# Altium footprint library PCB_ConnectorHDR.PcbLib: 221 footprints (part 7 of 14)
Each footprint in its own frame and in the unit in brackets; x right, y up, seen from the top. Pads: shape width x height; smd on the part's side, far side on the other; paste and mask are expansions set on the pad; w line width, h text height; cw(c..) or ccw(c..) is an arc to the next point about the centre after c.
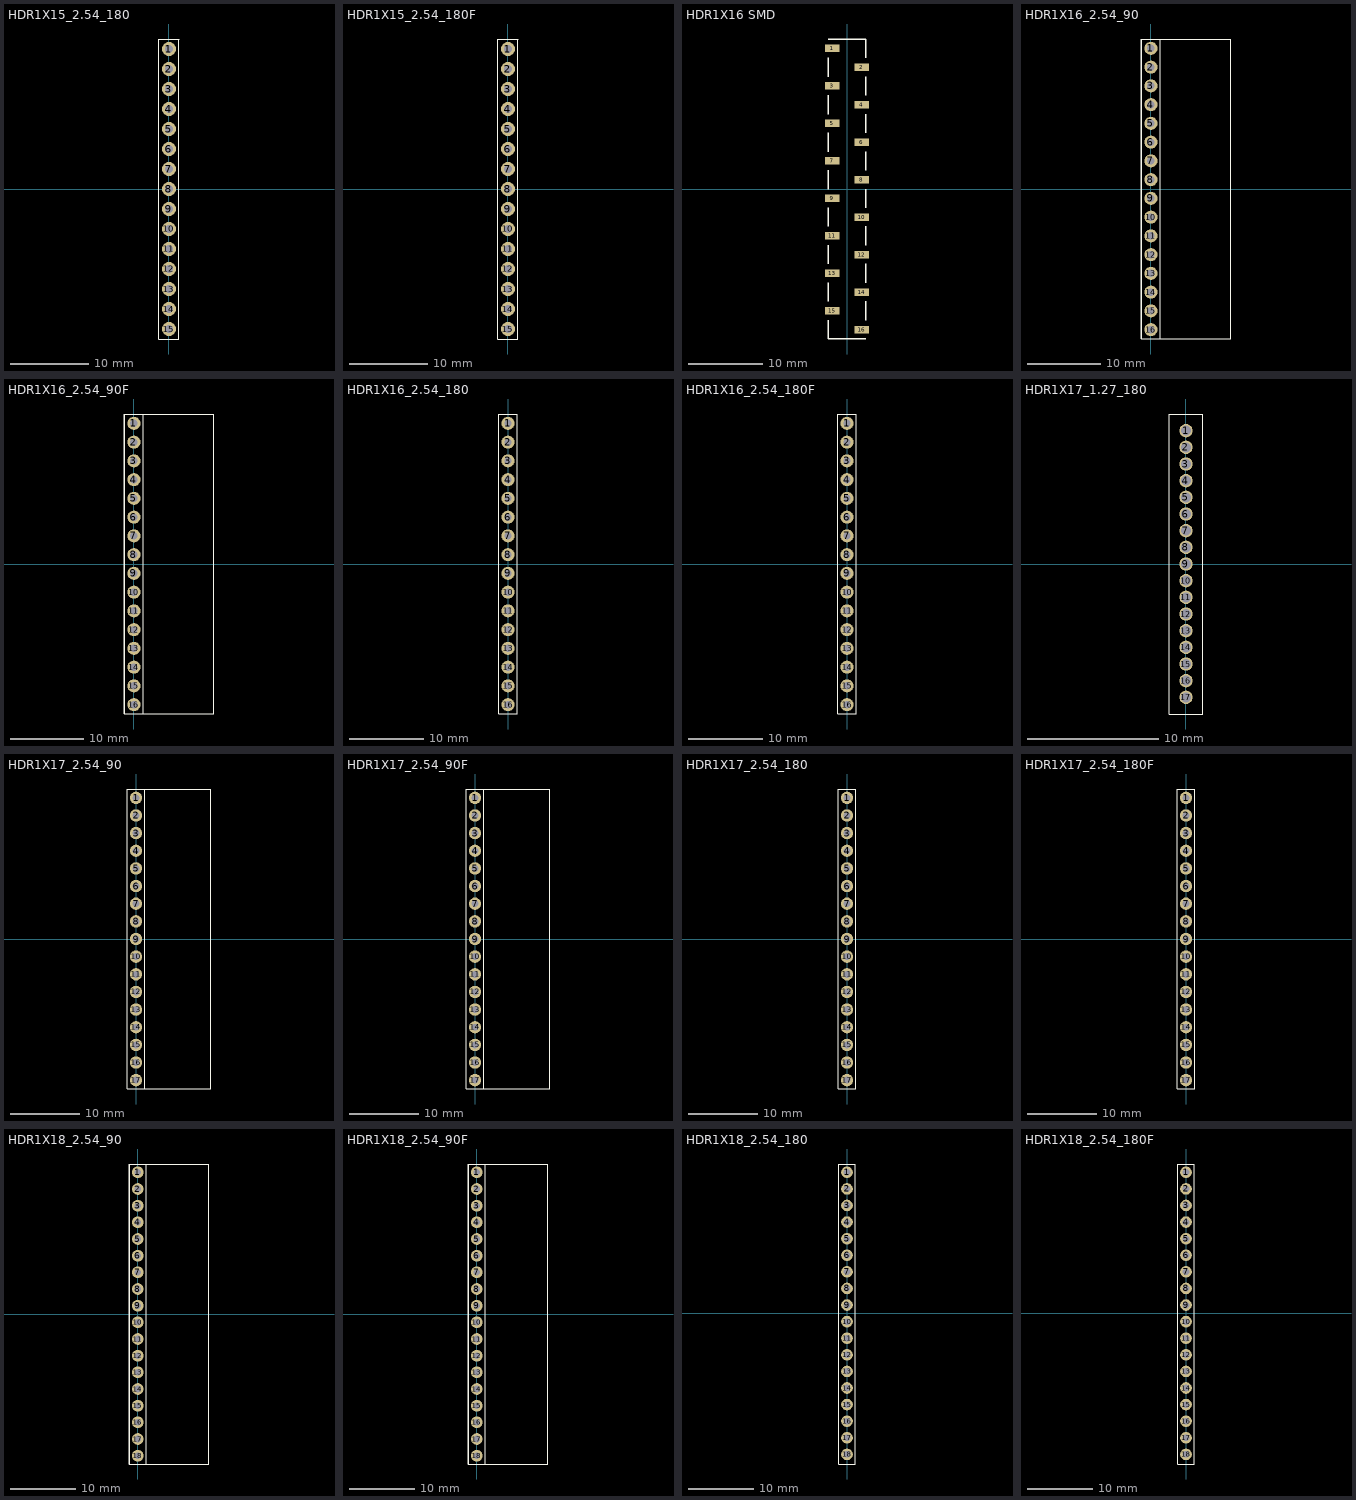
[diagram p6: the footprints below, top view; thin cyan lines are the x and y axes]

## HDR1X15_2.54_180 [mil]
height 169.29
pads (15):
  round 70 hole 39.37: 1(0,700) 2(0,600) 3(0,500) 4(0,400) 5(0,300) 6(0,200) 7(0,100) 8(0,0) 9(0,-100) 10(0,-200) 11(0,-300) 12(0,-400) 13(0,-500) 14(0,-600) 15(0,-700)
Top Overlay:
  lines w2: -50,-750 -50,750 ; -50,-750 50,-750 ; -50,-750 50,-750 ; -50,-750 -50,750 ; -50,750 50,750 ; -50,750 50,750 ; 50,-750 50,750 ; 50,-750 50,750
3D body "pin_header_aw140-eg-g15d.stp": height 322.83, standoff -118.11, extent -49.18,-749.99 49.18,750

## HDR1X15_2.54_180F [mil]
height 169.29
pads (15):
  round 70 hole 39.37: 1(0,700) 2(0,600) 3(0,500) 4(0,400) 5(0,300) 6(0,200) 7(0,100) 8(0,0) 9(0,-100) 10(0,-200) 11(0,-300) 12(0,-400) 13(0,-500) 14(0,-600) 15(0,-700)
Top Overlay:
  lines w2: -50,-750 -50,750 ; -50,-750 50,-750 ; -50,-750 50,-750 ; -50,-750 -50,750 ; -50,750 50,750 ; -50,750 50,750 ; 50,-750 50,750 ; 50,-750 50,750
3D body "female_header_a-bl254-eg-g15d.stp": height 334.65, standoff -125.98, extent -49.21,-754.84 49.21,755

## HDR1X16 SMD [mm]
pads (16):
  rect 2x1 smd: 1(-2,19.05) 2(2,16.51) 3(-2,13.97) 4(2,11.43) 5(-2,8.89) 6(2,6.35) 7(-2,3.81) 8(2,1.27) 9(-2,-1.27) 10(2,-3.81) 11(-2,-6.35) 12(2,-8.89) 13(-2,-11.43) 14(2,-13.97) 15(-2,-16.51) 16(2,-19.05)
Top Overlay:
  lines w0.2: -2.54,-17.78 -2.54,-20.32 2.54,-20.32 ; -2.54,-15.24 -2.54,-12.7 ; -2.54,-10.16 -2.54,-7.62 ; -2.54,-5.08 -2.54,-2.54 ; -2.54,0 -2.54,2.54 ; -2.54,5.08 -2.54,7.62 ; -2.54,10.16 -2.54,12.7 ; -2.54,15.24 -2.54,17.78 ; -2.54,20.32 2.54,20.32 2.54,17.78 ; 2.54,-17.78 2.54,-15.24 ; 2.54,-12.7 2.54,-10.16 ; 2.54,-7.62 2.54,-5.08 ; 2.54,-2.54 2.54,0 ; 2.54,2.54 2.54,5.08 ; 2.54,7.62 2.54,10.16 ; 2.54,12.7 2.54,15.24
3D body "SSM-116-L-SV-BE.stp": height 7.37, standoff -0.13, extent -2.286,-20.32 2.286,20.32

## HDR1X16_2.54_90 [mil]
height 169.29
pads (16):
  round 70 hole 39.37: 1(0,750) 2(0,650) 3(0,550) 4(0,450) 5(0,350) 6(0,250) 7(0,150) 8(0,50) 9(0,-50) 10(0,-150) 11(0,-250) 12(0,-350) 13(0,-450) 14(0,-550) 15(0,-650) 16(0,-750)
Top Overlay:
  lines w2: -51,-300 -51,800 ; -51,800 425,800 425,-800 -51,-800 -51,800 ; -50,-800 50,-800 ; -50,-800 -50,800 ; -50,-800 50,-800 ; -50,-800 -50,800 ; -50,800 50,800 ; -50,800 50,800 ; 50,-800 50,800 ; 50,-800 50,800
3D body "pin_header_aw140-ea-g16g.stp": height 98.93, standoff -93.99, extent -13,-796.13 425.58,796

## HDR1X16_2.54_90F [mil]
height 169.29
pads (16):
  round 70 hole 39.37: 1(0,750) 2(0,650) 3(0,550) 4(0,450) 5(0,350) 6(0,250) 7(0,150) 8(0,50) 9(0,-50) 10(0,-150) 11(0,-250) 12(0,-350) 13(0,-450) 14(0,-550) 15(0,-650) 16(0,-750)
Top Overlay:
  lines w2: -51,-300 -51,800 ; -51,800 -51,-800 425,-800 425,800 -51,800 ; -50,-800 -50,800 ; -50,-800 50,-800 ; -50,-800 -50,800 ; -50,-800 50,-800 ; -50,800 50,800 ; -50,800 50,800 ; 50,-800 50,800 ; 50,-800 50,800
3D body "female_header_a-bl254-ea-g16d.stp": height 98.93, standoff -125.48, extent -9,-804.84 387.06,805

## HDR1X16_2.54_180 [mil]
height 169.29
pads (16):
  round 70 hole 39.37: 1(0,750) 2(0,650) 3(0,550) 4(0,450) 5(0,350) 6(0,250) 7(0,150) 8(0,50) 9(0,-50) 10(0,-150) 11(0,-250) 12(0,-350) 13(0,-450) 14(0,-550) 15(0,-650) 16(0,-750)
Top Overlay:
  lines w2: -50,-800 50,-800 ; -50,-800 -50,800 ; -50,-800 50,-800 ; -50,-800 -50,800 ; -50,800 50,800 ; -50,800 50,800 ; 50,-800 50,800 ; 50,-800 50,800
3D body "pin_header_aw140-eg-g16d.stp": height 322.83, standoff -118.11, extent -49.18,-800 49.18,800

## HDR1X16_2.54_180F [mil]
height 169.29
pads (16):
  round 70 hole 39.37: 1(0,750) 2(0,650) 3(0,550) 4(0,450) 5(0,350) 6(0,250) 7(0,150) 8(0,50) 9(0,-50) 10(0,-150) 11(0,-250) 12(0,-350) 13(0,-450) 14(0,-550) 15(0,-650) 16(0,-750)
Top Overlay:
  lines w2: -50,-800 50,-800 ; -50,-800 -50,800 ; -50,-800 50,-800 ; -50,-800 -50,800 ; -50,800 50,800 ; -50,800 50,800 ; 50,-800 50,800 ; 50,-800 50,800
3D body "female_header_a-bl254-eg-g16d.stp": height 334.65, standoff -125.98, extent -49.21,-804.84 49.21,805

## HDR1X17_1.27_180 [mil]
height 169.29
pads (17):
  round 40 hole 30: 1(0,400) 2(0,350) 3(0,300) 4(0,250) 5(0,200) 6(0,150) 7(0,100) 8(0,50) 9(0,0) 10(0,-50) 11(0,-100) 12(0,-150) 13(0,-200) 14(0,-250) 15(0,-300) 16(0,-350) 17(0,-400)
Top Overlay:
  lines w2: -50,-450 50,-450 ; -50,-450 -50,450 ; -50,-450 -50,450 ; -50,-450 50,-450 ; -50,450 50,450 ; -50,450 50,450 ; 50,-450 50,450 ; 50,-450 50,450
3D body "pin_header_a-sl127-eg-g17d.stp": height 210.24, standoff -102.36, extent -49.21,-424.99 49.21,425.01

## HDR1X17_2.54_90 [mil]
height 169.29
pads (17):
  round 70 hole 39.37: 1(0,800) 2(0,700) 3(0,600) 4(0,500) 5(0,400) 6(0,300) 7(0,200) 8(0,100) 9(0,0) 10(0,-100) 11(0,-200) 12(0,-300) 13(0,-400) 14(0,-500) 15(0,-600) 16(0,-700) 17(0,-800)
Top Overlay:
  lines w2: -51,-250 -51,850 ; -51,850 425,850 425,-850 -51,-850 -51,850 ; -50,-850 50,-850 ; -50,-850 -50,850 ; -50,-850 50,-850 ; -50,-850 -50,850 ; -50,850 50,850 ; -50,850 50,850 ; 50,-850 50,850 ; 50,-850 50,850
3D body "pin_header_aw140-ea-g17g.stp": height 98.93, standoff -93.99, extent -13,-846.13 425.58,846

## HDR1X17_2.54_90F [mil]
height 169.29
pads (17):
  round 70 hole 39.37: 1(0,800) 2(0,700) 3(0,600) 4(0,500) 5(0,400) 6(0,300) 7(0,200) 8(0,100) 9(0,0) 10(0,-100) 11(0,-200) 12(0,-300) 13(0,-400) 14(0,-500) 15(0,-600) 16(0,-700) 17(0,-800)
Top Overlay:
  lines w2: -51,-250 -51,850 ; -51,850 -51,-850 425,-850 425,850 -51,850 ; -50,-850 -50,850 ; -50,-850 50,-850 ; -50,-850 -50,850 ; -50,-850 50,-850 ; -50,850 50,850 ; -50,850 50,850 ; 50,-850 50,850 ; 50,-850 50,850
3D body "female_header_a-bl254-ea-g17d.stp": height 98.93, standoff -125.48, extent -8,-854.84 388.06,855

## HDR1X17_2.54_180 [mil]
height 169.29
pads (17):
  round 70 hole 39.37: 1(0,800) 2(0,700) 3(0,600) 4(0,500) 5(0,400) 6(0,300) 7(0,200) 8(0,100) 9(0,0) 10(0,-100) 11(0,-200) 12(0,-300) 13(0,-400) 14(0,-500) 15(0,-600) 16(0,-700) 17(0,-800)
Top Overlay:
  lines w2: -50,-850 -50,850 ; -50,-850 50,-850 ; -50,-850 -50,850 ; -50,-850 50,-850 ; -50,850 50,850 ; -50,850 50,850 ; 50,-850 50,850 ; 50,-850 50,850
3D body "pin_header_aw140-eg-g17d.stp": height 322.83, standoff -118.11, extent -49.18,-850 49.18,850

## HDR1X17_2.54_180F [mil]
height 169.29
pads (17):
  round 70 hole 39.37: 1(0,800) 2(0,700) 3(0,600) 4(0,500) 5(0,400) 6(0,300) 7(0,200) 8(0,100) 9(0,0) 10(0,-100) 11(0,-200) 12(0,-300) 13(0,-400) 14(0,-500) 15(0,-600) 16(0,-700) 17(0,-800)
Top Overlay:
  lines w2: -50,-850 50,-850 ; -50,-850 -50,850 ; -50,-850 50,-850 ; -50,-850 -50,850 ; -50,850 50,850 ; -50,850 50,850 ; 50,-850 50,850 ; 50,-850 50,850
3D body "female_header_a-bl254-eg-g17d.stp": height 334.65, standoff -125.98, extent -49.21,-854.84 49.21,855

## HDR1X18_2.54_90 [mil]
height 169.29
pads (18):
  round 70 hole 39.37: 1(0,850) 2(0,750) 3(0,650) 4(0,550) 5(0,450) 6(0,350) 7(0,250) 8(0,150) 9(0,50) 10(0,-50) 11(0,-150) 12(0,-250) 13(0,-350) 14(0,-450) 15(0,-550) 16(0,-650) 17(0,-750) 18(0,-850)
Top Overlay:
  lines w2: -51,-200 -51,900 ; -51,900 425,900 425,-900 -51,-900 -51,900 ; -50,-900 50,-900 ; -50,-900 -50,900 ; -50,-900 50,-900 ; -50,-900 -50,900 ; -50,900 50,900 ; -50,900 50,900 ; 50,-900 50,900 ; 50,-900 50,900
3D body "pin_header_aw140-ea-g18g.stp": height 98.93, standoff -93.99, extent -13,-896.13 425.58,896

## HDR1X18_2.54_90F [mil]
height 169.29
pads (18):
  round 70 hole 39.37: 1(0,850) 2(0,750) 3(0,650) 4(0,550) 5(0,450) 6(0,350) 7(0,250) 8(0,150) 9(0,50) 10(0,-50) 11(0,-150) 12(0,-250) 13(0,-350) 14(0,-450) 15(0,-550) 16(0,-650) 17(0,-750) 18(0,-850)
Top Overlay:
  lines w2: -51,-200 -51,900 ; -51,900 -51,-900 425,-900 425,900 -51,900 ; -50,-900 -50,900 ; -50,-900 50,-900 ; -50,-900 -50,900 ; -50,-900 50,-900 ; -50,900 50,900 ; -50,900 50,900 ; 50,-900 50,900 ; 50,-900 50,900
3D body "female_header_a-bl254-ea-g18d.stp": height 98.93, standoff -125.48, extent -8,-904.84 388.06,905

## HDR1X18_2.54_180 [mil]
height 169.29
pads (18):
  round 70 hole 39.37: 1(0,850) 2(0,750) 3(0,650) 4(0,550) 5(0,450) 6(0,350) 7(0,250) 8(0,150) 9(0,50) 10(0,-50) 11(0,-150) 12(0,-250) 13(0,-350) 14(0,-450) 15(0,-550) 16(0,-650) 17(0,-750) 18(0,-850)
Top Overlay:
  lines w2: -50,-908 50,-908 ; -50,-908 -50,900 ; -50,-908 50,-908 ; -50,-908 -50,900 ; -50,900 50,900 ; -50,900 50,900 ; 50,-908 50,900 ; 50,-908 50,900
3D body "pin_header_aw140-eg-g18d.stp": height 322.83, standoff -118.11, extent -49.18,-904 49.18,896

## HDR1X18_2.54_180F [mil]
height 169.29
pads (18):
  round 70 hole 39.37: 1(0,850) 2(0,750) 3(0,650) 4(0,550) 5(0,450) 6(0,350) 7(0,250) 8(0,150) 9(0,50) 10(0,-50) 11(0,-150) 12(0,-250) 13(0,-350) 14(0,-450) 15(0,-550) 16(0,-650) 17(0,-750) 18(0,-850)
Top Overlay:
  lines w2: -50,-908 50,-908 ; -50,-908 -50,900 ; -50,-908 50,-908 ; -50,-908 -50,900 ; -50,900 50,900 ; -50,900 50,900 ; 50,-908 50,900 ; 50,-908 50,900
3D body "female_header_a-bl254-eg-g18d.stp": height 334.65, standoff -125.98, extent -49.21,-904.84 49.21,905